# Altium footprint library Connectors.PcbLib: 56 footprints (part 4 of 4)
Each footprint in its own frame and in the unit in brackets; x right, y up, seen from the top. Pads: shape width x height; smd on the part's side, far side on the other; paste and mask are expansions set on the pad; w line width, h text height; cw(c..) or ccw(c..) is an arc to the next point about the centre after c.
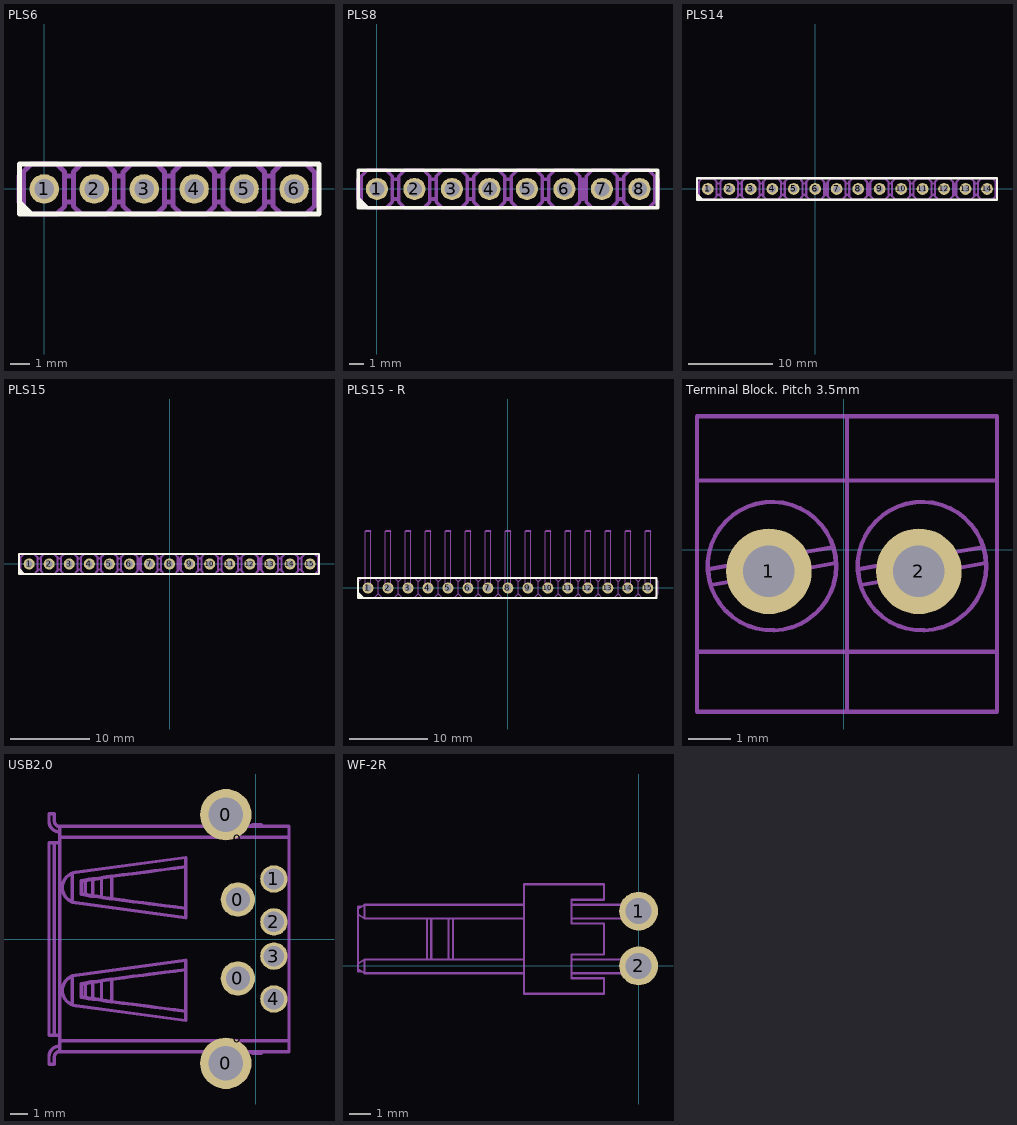
[diagram p3: the footprints below, top view; thin cyan lines are the x and y axes]

## PLS6 [mm]
pads (6):
  round 1.5 hole 1: 1(0,0) 2(2.54,0) 3(5.08,0) 4(7.62,0) 5(10.16,0) 6(12.7,0)
Top Overlay:
  region: -1.27,-0.5 -0.5,-1.27 -1.27,-1.27
  lines w0.254: -1.27,-1.27 -1.27,1.27 13.97,1.27 13.97,-1.27 -1.27,-1.27
Mechanical 3:
  text ".Designator" at 1.905,-0.635 h2
Mechanical 13:
  lines w0.254: -1.064,-0.674 -1.284,-0.674 -1.284,0.666 -1.064,0.666 ; 1.036,-0.674 1.476,-0.674 ; 1.036,0.666 1.476,0.666 ; 3.576,-0.674 4.016,-0.674 ; 3.576,0.666 4.016,0.666 ; 6.116,-0.674 6.556,-0.674 ; 6.116,0.666 6.556,0.666 ; 8.656,-0.674 9.096,-0.674 ; 8.656,0.666 9.096,0.666 ; 11.196,-0.674 11.636,-0.674 ; 11.196,0.666 11.636,0.666 ; 13.736,-0.674 13.956,-0.674 13.956,0.666 13.736,0.666 ; -0.334,-0.324 -0.134,-0.124 ; -0.334,-0.324 -0.334,0.316 ; -0.334,-0.324 0.306,-0.324 ; -0.334,0.316 -0.134,0.116 ; -0.334,0.316 0.306,0.316 ; -0.134,-0.124 -0.134,0.116 ; -0.134,-0.124 0.106,-0.124 ; -0.134,0.116 0.106,0.116 ; 0.106,-0.124 0.106,0.116 ; 0.106,-0.124 0.306,-0.324 ; 0.106,0.116 0.306,0.316 ; 0.306,-0.324 0.306,0.316 ; 2.206,-0.324 2.846,-0.324 ; 2.206,-0.324 2.406,-0.124 ; 2.206,-0.324 2.206,0.316 ; 2.206,0.316 2.846,0.316 ; 2.206,0.316 2.406,0.116 ; 2.406,-0.124 2.406,0.116 ; 2.406,-0.124 2.646,-0.124 ; 2.406,0.116 2.646,0.116 ; 2.646,-0.124 2.646,0.116 ; 2.646,-0.124 2.846,-0.324 ; 2.646,0.116 2.846,0.316 ; 2.846,-0.324 2.846,0.316 ; 4.746,-0.324 4.946,-0.124 ; 4.746,-0.324 4.746,0.316 ; 4.746,-0.324 5.386,-0.324 ; 4.746,0.316 5.386,0.316 ; 4.746,0.316 4.946,0.116 ; 4.946,-0.124 4.946,0.116 ; 4.946,-0.124 5.186,-0.124 ; 4.946,0.116 5.186,0.116 ; 5.186,-0.124 5.186,0.116 ; 5.186,-0.124 5.386,-0.324 ; 5.186,0.116 5.386,0.316 ; 5.386,-0.324 5.386,0.316 ; 7.286,-0.324 7.486,-0.124 ; 7.286,-0.324 7.286,0.316 ; 7.286,-0.324 7.926,-0.324 ; 7.286,0.316 7.486,0.116 ; 7.286,0.316 7.926,0.316 ; 7.486,-0.124 7.486,0.116 ; 7.486,-0.124 7.726,-0.124 ; 7.486,0.116 7.726,0.116 ; 7.726,-0.124 7.726,0.116 ; 7.726,-0.124 7.926,-0.324 ; 7.726,0.116 7.926,0.316 ; 7.926,-0.324 7.926,0.316 ; 9.826,-0.324 10.026,-0.124 ; 9.826,-0.324 9.826,0.316 ; 9.826,-0.324 10.466,-0.324 ; 9.826,0.316 10.026,0.116 ; 9.826,0.316 10.466,0.316 ; 10.026,-0.124 10.026,0.116 ; 10.026,-0.124 10.266,-0.124 ; 10.026,0.116 10.266,0.116 ; 10.266,-0.124 10.466,-0.324 ; 10.266,-0.124 10.266,0.116 ; 10.266,0.116 10.466,0.316 ; 10.466,-0.324 10.466,0.316 ; 12.366,-0.324 13.006,-0.324 ; 12.366,-0.324 12.566,-0.124 ; 12.366,-0.324 12.366,0.316 ; 12.366,0.316 13.006,0.316 ; 12.366,0.316 12.566,0.116 ; 12.566,-0.124 12.806,-0.124 ; 12.566,-0.124 12.566,0.116 ; 12.566,0.116 12.806,0.116 ; 12.806,-0.124 13.006,-0.324 ; 12.806,-0.124 12.806,0.116 ; 12.806,0.116 13.006,0.316 ; 13.006,-0.324 13.006,0.316 ; -1.064,-0.874 -0.664,-1.274 0.636,-1.274 1.036,-0.874 1.036,0.866 0.636,1.266 -0.664,1.266 -1.064,0.866 -1.064,-0.874 ; 1.476,-0.874 1.876,-1.274 3.176,-1.274 3.576,-0.874 3.576,0.866 3.176,1.266 1.876,1.266 1.476,0.866 1.476,-0.874 ; 4.016,-0.874 4.416,-1.274 5.716,-1.274 6.116,-0.874 6.116,0.866 5.716,1.266 4.416,1.266 4.016,0.866 4.016,-0.874 ; 6.556,-0.874 6.956,-1.274 8.256,-1.274 8.656,-0.874 8.656,0.866 8.256,1.266 6.956,1.266 6.556,0.866 6.556,-0.874 ; 9.096,-0.874 9.496,-1.274 10.796,-1.274 11.196,-0.874 11.196,0.866 10.796,1.266 9.496,1.266 9.096,0.866 9.096,-0.874 ; 11.636,-0.874 12.036,-1.274 13.336,-1.274 13.736,-0.874 13.736,0.866 13.336,1.266 12.036,1.266 11.636,0.866 11.636,-0.874
3D body "User Library-PLS-6-1.step": height 8.54, standoff -3, extent -1.27,-1.27 13.97,1.27

## PLS8 [mm]
pads (8):
  round 1.5 hole 1: 1(0,0) 2(2.54,0) 3(5.08,0) 4(7.62,0) 5(10.16,0) 6(12.7,0) 7(15.24,0) 8(17.78,0)
Top Overlay:
  region: -1.27,-0.5 -0.5,-1.27 -1.27,-1.27
  lines w0.254: -1.27,-1.27 19,-1.27 19,1.27 -1.27,1.27 -1.27,-1.27
Mechanical 3:
  text ".Designator" at 1.905,-0.635 h2
Mechanical 13:
  drawing of 181 lines, arcs and shapes, not listed
3D body "User Library-PLD-2.step": height 8.5, standoff -3, extent -1.19,-1.27 3.81,1.27
3D body "User Library-PLD-2.step": height 8.5, standoff -3, extent 3.89,-1.27 8.89,1.27
3D body "User Library-PLD-2.step": height 8.5, standoff -3, extent 8.97,-1.27 13.97,1.27
3D body "User Library-PLD-2.step": height 8.5, standoff -3, extent 14.05,-1.27 19.05,1.27

## PLS14 [mm]
pads (14):
  round 1.4 hole 0.85: 1(-12.7,0) 2(-10.16,0) 3(-7.62,0) 4(-5.08,0) 5(-2.54,0) 6(0,0) 7(2.54,0) 8(5.08,0) 9(7.62,0) 10(10.16,0) 11(12.7,0) 12(15.24,0) 13(17.78,0) 14(20.32,0)
Top Overlay:
  region: -13.97,-0.5 -13.2,-1.27 -13.97,-1.27
  lines w0.254: -13.97,-1.27 21.5,-1.27 21.5,1.27 -13.97,1.27 -13.97,-1.27
Mechanical 3:
  text ".Designator" at -10.795,-0.635 h2
Mechanical 13:
  drawing of 320 lines, arcs and shapes, not listed
3D body "User Library-PLD-2.step": height 8.5, standoff -3, extent 16.59,-1.27 21.59,1.27
3D body "User Library-PLD-2.step": height 8.5, standoff -3, extent 11.51,-1.27 16.51,1.27
3D body "User Library-PLD-2.step": height 8.5, standoff -3, extent 6.43,-1.27 11.43,1.27
3D body "User Library-PLD-2.step": height 8.5, standoff -3, extent -13.89,-1.27 -8.89,1.27
3D body "User Library-PLD-2.step": height 8.5, standoff -3, extent -8.81,-1.27 -3.81,1.27
3D body "User Library-PLD-2.step": height 8.5, standoff -3, extent -3.73,-1.27 1.27,1.27
3D body "User Library-PLD-2.step": height 8.5, standoff -3, extent 1.35,-1.27 6.35,1.27

## PLS15 [mm]
pads (15):
  round 1.4 hole 0.85: 1(-17.78,0) 2(-15.24,0) 3(-12.7,0) 4(-10.16,0) 5(-7.62,0) 6(-5.08,0) 7(-2.54,0) 8(0,0) 9(2.54,0) 10(5.08,0) 11(7.62,0) 12(10.16,0) 13(12.7,0) 14(15.24,0) 15(17.78,0)
Top Overlay:
  region: -19.05,-0.5 -18.28,-1.27 -19.05,-1.27
  lines w0.254: -19.05,-1.27 18.92,-1.27 18.92,1.27 -19.05,1.27 -19.05,-1.27
Mechanical 3:
  text ".Designator" at -15.875,-0.635 h2
Mechanical 13:
  drawing of 343 lines, arcs and shapes, not listed
3D body "User Library-PLD-2.step": height 8.5, standoff -3, extent 11.51,-1.27 16.51,1.27
3D body "User Library-PLD-2.step": height 8.5, standoff -3, extent 6.43,-1.27 11.43,1.27
3D body "User Library-PLD-2.step": height 8.5, standoff -3, extent 1.35,-1.27 6.35,1.27
3D body "User Library-PLD-2.step": height 8.5, standoff -3, extent -18.97,-1.27 -13.97,1.27
3D body "User Library-PLD-2.step": height 8.5, standoff -3, extent -13.89,-1.27 -8.89,1.27
3D body "User Library-PLD-2.step": height 8.5, standoff -3, extent -8.81,-1.27 -3.81,1.27
3D body "User Library-PLD-2.step": height 8.5, standoff -3, extent -3.73,-1.27 1.27,1.27
3D body "User Library-PLD-2.step": height 8.5, standoff -3, extent 14.05,-1.27 19.05,1.27

## PLS15 - R [mm]
pads (15):
  round 1.4 hole 0.85: 1(-17.78,0) 2(-15.24,0) 3(-12.7,0) 4(-10.16,0) 5(-7.62,0) 6(-5.08,0) 7(-2.54,0) 8(0,0) 9(2.54,0) 10(5.08,0) 11(7.62,0) 12(10.16,0) 13(12.7,0) 14(15.24,0) 15(17.78,0)
Top Overlay:
  region: -19.05,-0.5 -18.28,-1.27 -19.05,-1.27
  lines w0.254: -19.05,-1.27 -19.05,1.27 18.92,1.27 18.92,-1.27 -19.05,-1.27
Mechanical 13:
  drawing of 296 lines, arcs and shapes, not listed
3D body "User Library-PLS-1R_D1.STEP": height 2.5, standoff -3, extent 16.51,-0.32 19.05,10.04
3D body "User Library-PLS-1R_D1.STEP": height 2.5, standoff -3, extent 13.97,-0.32 16.51,10.04
3D body "User Library-PLS-1R_D1.STEP": height 2.5, standoff -3, extent 13.97,-0.32 16.51,10.04
3D body "User Library-PLS-1R_D1.STEP": height 2.5, standoff -3, extent 11.43,-0.32 13.97,10.04
3D body "User Library-PLS-1R_D1.STEP": height 2.5, standoff -3, extent 8.89,-0.32 11.43,10.04
3D body "User Library-PLS-1R_D1.STEP": height 2.5, standoff -3, extent 6.35,-0.32 8.89,10.04
3D body "User Library-PLS-1R_D1.STEP": height 2.5, standoff -3, extent 3.81,-0.32 6.35,10.04
3D body "User Library-PLS-1R_D1.STEP": height 2.5, standoff -3, extent 1.27,-0.32 3.81,10.04
3D body "User Library-PLS-1R_D1.STEP": height 2.5, standoff -3, extent -1.27,-0.32 1.27,10.04
3D body "User Library-PLS-1R_D1.STEP": height 2.5, standoff -3, extent -3.81,-0.32 -1.27,10.04
3D body "User Library-PLS-1R_D1.STEP": height 2.5, standoff -3, extent -6.35,-0.32 -3.81,10.04
3D body "User Library-PLS-1R_D1.STEP": height 2.5, standoff -3, extent -8.89,-0.32 -6.35,10.04
3D body "User Library-PLS-1R_D1.STEP": height 2.5, standoff -3, extent -11.43,-0.32 -8.89,10.04
3D body "User Library-PLS-1R_D1.STEP": height 2.5, standoff -3, extent -13.97,-0.32 -11.43,10.04
3D body "User Library-PLS-1R_D1.STEP": height 2.5, standoff -3, extent -16.51,-0.32 -13.97,10.04
3D body "User Library-PLS-1R_D1.STEP": height 2.5, standoff -3, extent -19.05,-0.32 -16.51,10.04

## Terminal Block. Pitch 3.5mm [mm]
pads (2):
  round 2 hole 1.2: 1(-1.75,-0.5) 2(1.75,-0.5)
Mechanical 13:
  circle w0.1: c1.823,-0.38 r1.5
  circle w0.1: c-1.677,-0.38 r1.5
  lines w0.1: -3.427,-2.38 -3.427,1.62 ; -3.427,-2.38 0.073,-2.38 ; -3.427,-2.38 -3.427,-3.78 -3.027,-3.78 -0.327,-3.78 0.073,-3.78 ; -3.427,1.62 0.073,1.62 ; -3.427,1.62 -3.427,3.12 0.073,3.12 ; -2.455,-0.325 cw(c-1.677,-0.38) -1.811,0.389 cw(c-1.677,-0.38) -0.963,-0.064 ; -2.455,-0.325 -0.963,-0.064 ; -2.455,-0.325 -3.165,-0.45 ccw(c-1.677,-0.38) -3.1,-0.819 -2.39,-0.695 ; -2.39,-0.695 ccw(c-1.677,-0.38) -1.542,-1.148 ccw(c-1.677,-0.38) -0.898,-0.434 ; -2.39,-0.695 -0.898,-0.434 ; -0.963,-0.064 -0.253,0.06 cw(c-1.677,-0.38) -0.188,-0.309 -0.898,-0.434 ; 0.073,-3.78 0.473,-3.78 3.173,-3.78 3.573,-3.78 3.573,-2.38 ; 0.073,-3.78 0.073,-2.38 ; 0.073,-2.38 0.073,1.62 ; 0.073,-2.38 3.573,-2.38 ; 0.073,1.62 0.073,3.12 ; 0.073,1.62 3.573,1.62 ; 0.073,3.12 3.573,3.12 3.573,1.62 ; 1.045,-0.325 cw(c1.823,-0.38) 1.689,0.389 cw(c1.823,-0.38) 2.537,-0.064 ; 1.045,-0.325 2.537,-0.064 ; 1.045,-0.325 0.335,-0.45 ccw(c1.823,-0.38) 0.4,-0.819 1.11,-0.695 ; 1.11,-0.695 ccw(c1.823,-0.38) 1.958,-1.148 ccw(c1.823,-0.38) 2.602,-0.434 ; 1.11,-0.695 2.602,-0.434 ; 2.537,-0.064 3.247,0.06 cw(c1.823,-0.38) 3.312,-0.309 2.602,-0.434 ; 3.573,-2.38 3.573,1.62
3D body "User Library-KF350-2P.STEP": height 9.3, standoff -2.1, extent -3.5,-3.725 3.5,3.175

## USB2.0 [mm]
pads (10):
  round 3 hole 2: 0(-1.75,-7.25) 0(-1.75,7.25)
  rrect100% 2.5x1 on Keep-Out: 0(-1.05,-5.8) 0(-1.05,5.8)
  round 2 hole 1.4: 0(-1.05,-2.3) 0(-1.05,2.3)
  round 1.6 hole 1.2: 1(1.05,3.5) 2(1.05,1) 3(1.05,-1) 4(1.05,-3.5)
Mechanical 13:
  drawing of 640 lines, arcs and shapes, not listed
3D body "72w2538_292303-4.stp": height 8.62, standoff -2.65, extent -12,-8.117 2,8.117

## WF-2R [mm]
pads (2):
  round 1.8 hole 1.2: 1(0,2.54) 2(0,0)
Mechanical 13:
  lines w0.1: -12.846,-0.251 -13.011,-0.251 -13.011,-0.141 ; -12.846,2.749 -13.011,2.749 -13.011,2.639 ; -9.811,0.299 -9.811,2.199 ; -9.611,0.299 -9.611,2.199 ; -8.811,0.299 -8.811,2.199 ; -8.611,0.299 -8.611,2.199 ; -5.311,-0.341 -12.711,-0.341 ; -5.311,0.299 -12.711,0.299 ; -5.311,2.199 -12.711,2.199 ; -5.311,2.839 -12.711,2.839 ; -3.111,-0.341 -0.631,-0.341 ; -3.111,0.299 -0.631,0.299 ; -3.111,2.199 -0.631,2.199 ; -3.111,2.839 -0.631,2.839 ; -13.011,-0.141 -12.711,-0.341 ; -13.011,-0.141 -13.011,0.099 ; -13.011,0.099 -13.011,2.399 ; -13.011,0.099 -12.711,0.299 ; -13.011,2.399 -12.711,2.199 ; -13.011,2.399 -13.011,2.639 ; -13.011,2.639 -12.711,2.839 ; -12.711,-0.341 -12.711,0.299 ; -12.711,2.199 -12.711,2.839 ; -0.631,-0.341 -0.631,0.299 ; -0.631,-0.341 0.189,-0.341 0.189,0.299 -0.631,0.299 ; -0.631,2.199 -0.631,2.839 ; -0.631,2.199 0.189,2.199 0.189,2.839 -0.631,2.839 ; -5.311,-1.291 -5.311,3.789 -1.611,3.789 -1.611,3.069 -3.111,3.069 -3.111,1.969 -1.611,1.969 -1.611,0.529 -3.111,0.529 -3.111,-0.571 -1.611,-0.571 -1.611,-1.291 -5.311,-1.291
3D body "User Library-WF-2R.step": height 5.8, standoff -3.4, extent -12.95,-1.27 0.25,3.81